# Altium footprint library THU.PcbLib: 477 footprints (part 28 of 30)
Each footprint in its own frame and in the unit in brackets; x right, y up, seen from the top. Pads: shape width x height; smd on the part's side, far side on the other; paste and mask are expansions set on the pad; w line width, h text height; cw(c..) or ccw(c..) is an arc to the next point about the centre after c.
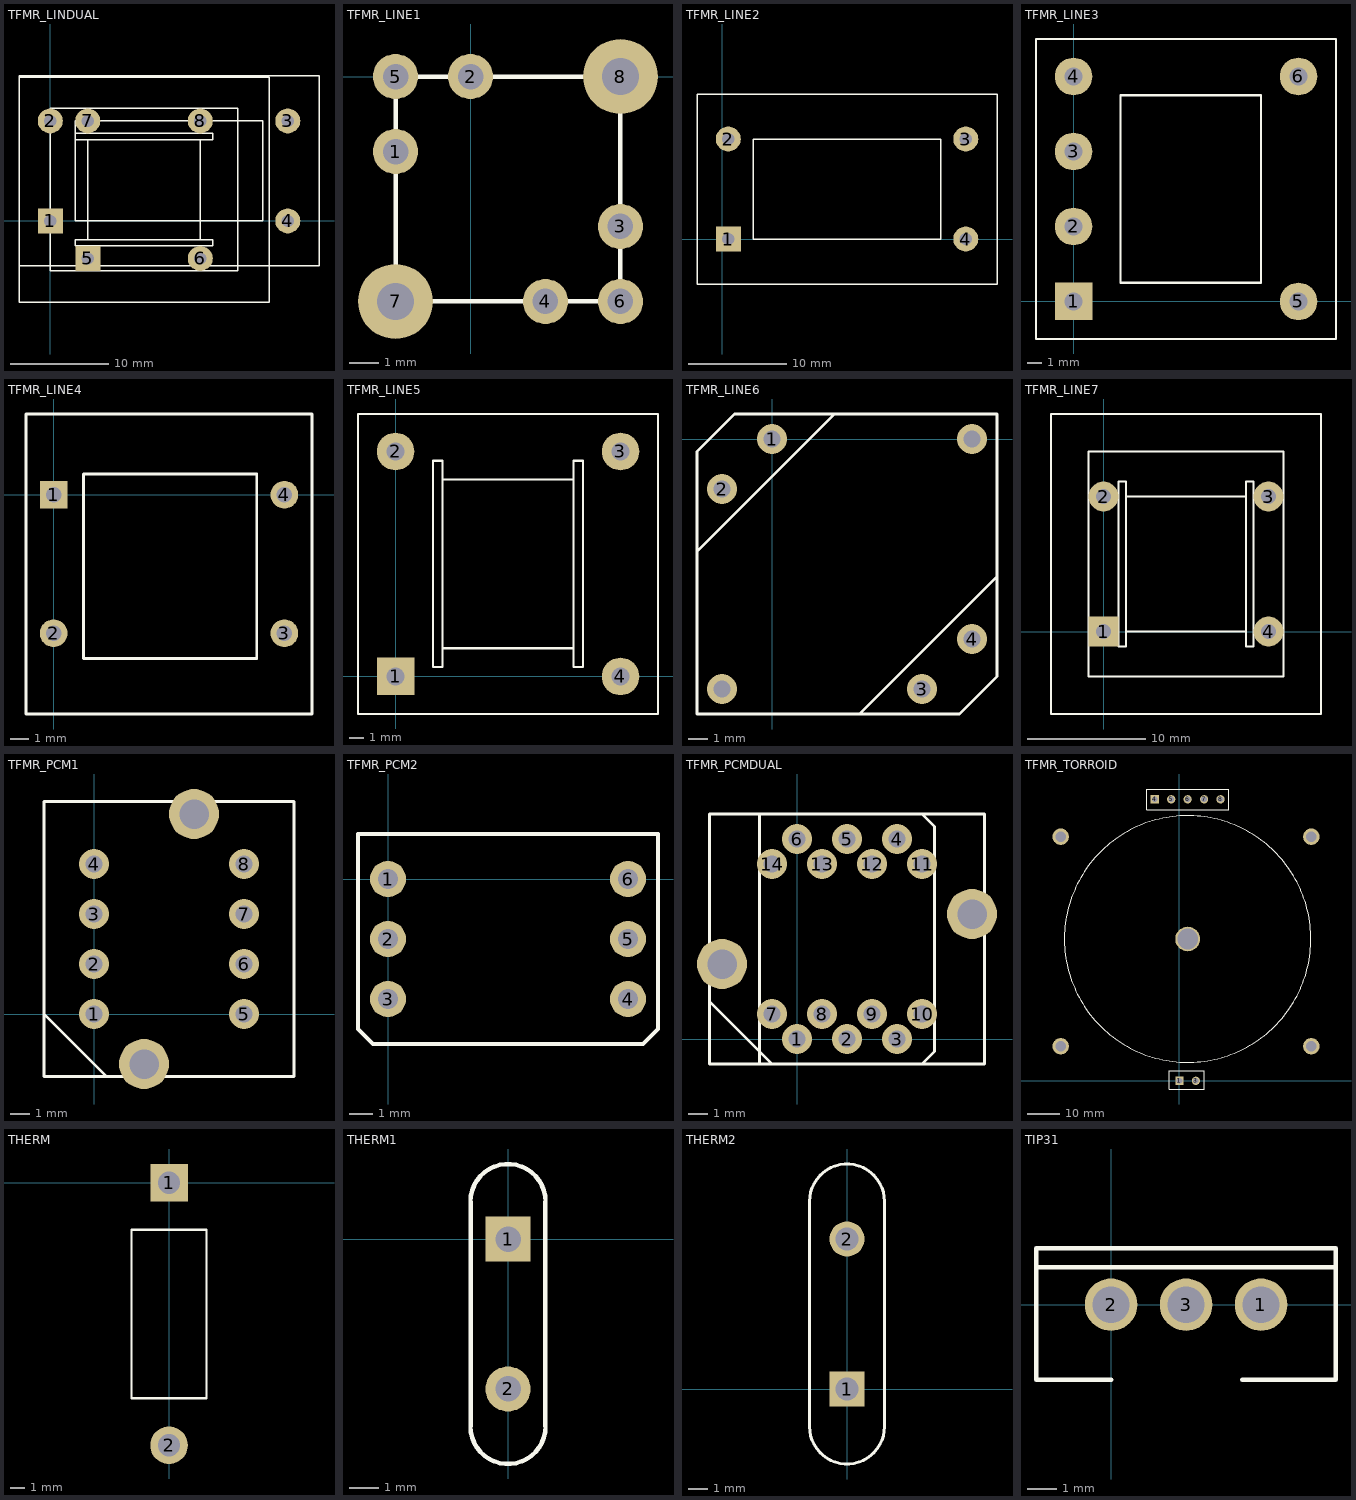
[diagram p27: the footprints below, top view; thin cyan lines are the x and y axes]

## TFMR_LINDUAL [mil]
pads (8):
  rect 100x100 hole 49: 1(0,0) 5(150,-150)
  round 100 hole 49: 2(0,400) 3(950,400) 4(950,0) 6(600,-150) 7(150,400) 8(600,400)
TopOverlay:
  lines w6: 150,-75 150,325 ; 600,-75 600,325 ; -125,-325 -125,575 875,575 875,-325 -125,-325 ; -125,-180 1075,-180 1075,580 -125,580 -125,-180 ; 0,-200 0,450 750,450 750,-200 0,-200 ; 100,-100 100,-75 650,-75 650,-100 100,-100 ; 100,0 100,400 850,400 850,0 100,0 ; 100,325 650,325 650,350 100,350 100,325

## TFMR_LINE1 [mil]
pads (8):
  round 60 hole 34: 1(-100,-100) 2(0,0) 3(200,-200) 4(100,-300) 5(-100,0) 6(200,-300)
  round 100 hole 49: 7(-100,-300) 8(200,0)
TopOverlay:
  lines w6: -100,-300 -100,0 200,0 200,-300 -100,-300

## TFMR_LINE2 [mil]
pads (4):
  rect 100x100 hole 49: 1(25,0)
  round 100 hole 49: 2(25,400) 3(975,400) 4(975,0)
TopOverlay:
  lines w6: -100,-180 -100,580 1100,580 1100,-180 -100,-180 ; 125,0 875,0 875,400 125,400 125,0

## TFMR_LINE3 [mil]
pads (6):
  rect 100x100 hole 49: 1(0,0)
  round 100 hole 49: 2(0,200) 3(0,400) 4(0,600) 5(600,0) 6(600,600)
TopOverlay:
  lines w6: -100,-100 -100,700 700,700 700,-100 -100,-100 ; 125,50 500,50 500,550 125,550 125,50

## TFMR_LINE4 [mil]
pads (4):
  rect 60x60 hole 34: 1(0,0)
  round 60 hole 34: 2(0,-300) 3(500,-300) 4(500,0)
TopOverlay:
  lines w6: -60,-475 -60,175 560,175 560,-475 -60,-475 ; 65,-355 65,45 440,45 440,-355 65,-355

## TFMR_LINE5 [mil]
pads (4):
  rect 100x100 hole 49: 1(0,0)
  round 100 hole 49: 2(0,600) 3(600,600) 4(600,0)
TopOverlay:
  lines w6: -100,-100 700,-100 700,700 -100,700 -100,-100 ; 100,25 125,25 125,575 100,575 100,25 ; 125,75 475,75 475,525 125,525 125,75 ; 475,25 500,25 500,575 475,575 475,25

## TFMR_LINE6 [mil]
pads (6):
  round 60 hole 34: 1(0,0) 2(-100,-100) 3(300,-500) 4(400,-400) ""(-100,-500) ""(400,0)
TopOverlay:
  lines w6: -150,-225 125,50 ; 175,-550 450,-275 ; -150,-550 375,-550 450,-475 450,50 -75,50 -150,-25 -150,-550

## TFMR_LINE7 [mil]
pads (4):
  rect 100x100 hole 49: 1(0,0)
  round 100 hole 49: 2(0,450) 3(550,450) 4(550,0)
TopOverlay:
  lines w6: 75,0 475,0 ; 75,450 475,450 ; -175,-275 -175,725 725,725 725,-275 -175,-275 ; -50,-150 -50,600 600,600 600,-150 -50,-150 ; 50,-50 50,500 75,500 75,-50 50,-50 ; 475,-50 500,-50 500,500 475,500 475,-50

## TFMR_PCM1 [mil]
pads (10):
  round 60 hole 34: 1(0,0) 2(0,100) 3(0,200) 4(0,300) 5(300,0) 6(300,100) 7(300,200) 8(300,300)
  round 100 hole 59: ""(100,-100) ""(200,400)
TopOverlay:
  lines w6: -100,0 25,-125 ; -100,-125 400,-125 400,425 -100,425 -100,-125

## TFMR_PCM2 [mil]
pads (6):
  round 60 hole 34: 1(0,0) 2(0,-100) 3(0,-200) 4(400,-200) 5(400,-100) 6(400,0)
TopOverlay:
  lines w6: -50,-250 -50,75 450,75 450,-250 425,-275 -25,-275 -50,-250

## TFMR_PCMDUAL [mil]
pads (16):
  round 60 hole 34: 1(0,0) 2(100,0) 3(200,0) 4(200,400) 5(100,400) 6(0,400) 7(-50,50) 8(50,50) 9(150,50) 10(250,50) 11(250,350) 12(150,350) 13(50,350) 14(-50,350)
  round 100 hole 59: ""(-150,150) ""(350,250)
TopOverlay:
  lines w6: -175,75 -50,-50 ; -175,-50 -175,450 375,450 375,-50 -175,-50 ; -75,-50 250,-50 275,-25 275,425 250,450 -75,450 -75,-50

## TFMR_TORROID [mil]
pads (12):
  rect 100x100 hole 70: 1(0,0) 4(-300,3425)
  round 100 hole 70: 3(200,0) 5(-100,3425) 6(100,3425) 7(300,3425) 8(500,3425)
  round 200 hole 124: ""(-1445,420) ""(-1445,2970) ""(1605,420) ""(1605,2970)
  round 300 hole 250: ""(100,1725)
TopOverlay:
  circle w6: c100,1725 r1500
  lines w6: -400,3300 -400,3550 600,3550 600,3300 -400,3300 ; -125,-100 300,-100 300,125 -125,125 -125,-100

## THERM [mil]
pads (2):
  rect 100x100 hole 59: 1(0,0)
  round 100 hole 59: 2(0,-700)
TopOverlay:
  lines w6: -100,-575 100,-575 100,-125 -100,-125 -100,-575

## THERM1 [mil]
pads (2):
  rect 60x60 hole 34: 1(0,0)
  round 60 hole 34: 2(0,-200)
TopOverlay:
  lines w6: -50,-250 ccw(c0,-250) 50,-250 50,50 ccw(c0,50) -50,50 -50,-250

## THERM2 [mil]
pads (2):
  rect 70x70 hole 46: 1(0,0)
  round 70 hole 46: 2(0,300)
TopOverlay:
  lines w6: -75,-75 ccw(c0,-75) 75,-75 75,375 ccw(c0,375) -75,375 -75,-75

## TIP31 [mil]
pads (3):
  round 70 hole 49: 1(200,0) 2(0,0) 3(100,0)
TopOverlay:
  lines w6: 0,-100 -100,-100 -100,50 ; 150,50 175,50 ; 175,-100 300,-100 300,50 ; -100,50 300,50 ; -100,50 -100,75 300,75 300,50